# Altium footprint library IC.Pcblib: 91 footprints (part 4 of 6)
Each footprint in its own frame and in the unit in brackets; x right, y up, seen from the top. Pads: shape width x height; smd on the part's side, far side on the other; paste and mask are expansions set on the pad; w line width, h text height; cw(c..) or ccw(c..) is an arc to the next point about the centre after c.
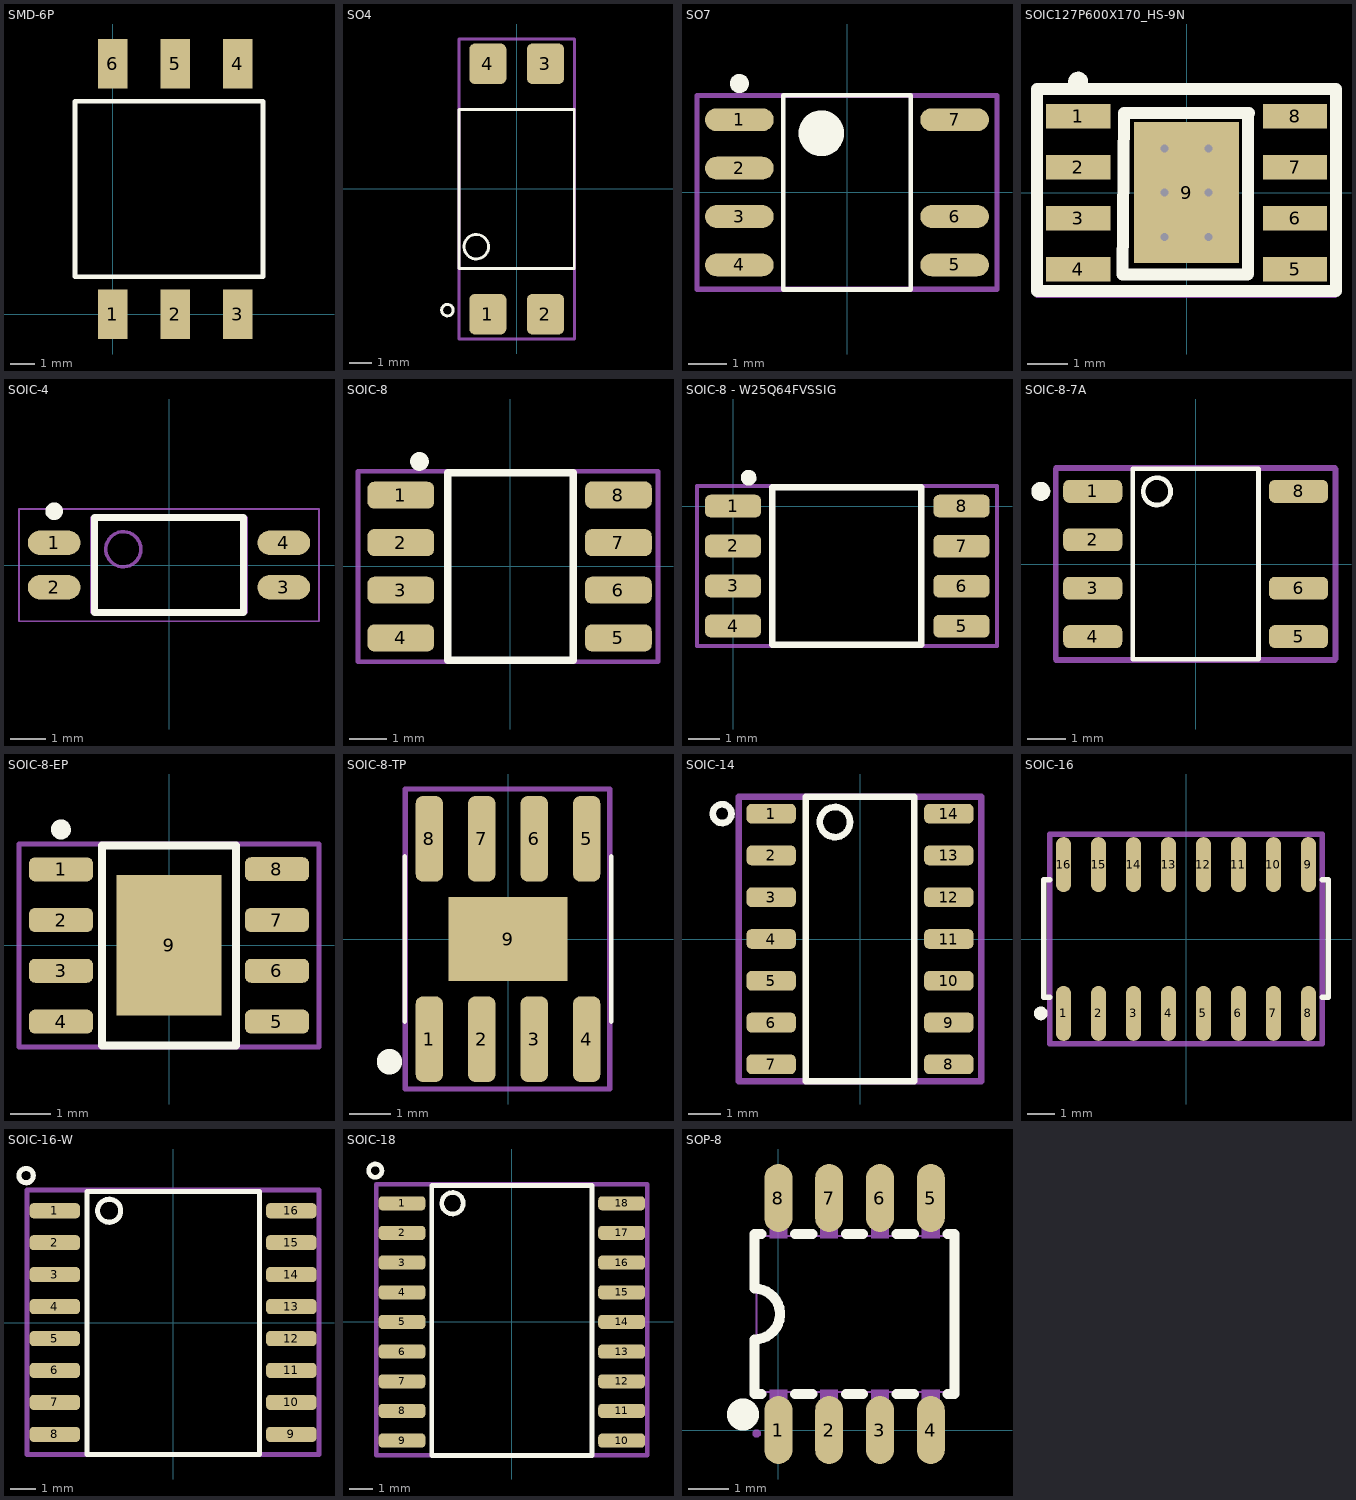
[diagram p3: the footprints below, top view; thin cyan lines are the x and y axes]

## SMD-6P [mm]
pads (6):
  rect 1.2x2 smd: 1(0,0) 2(2.54,0) 3(5.08,0) 4(5.08,10.16) 5(2.54,10.16) 6(0,10.16)
Top Overlay:
  lines w0.2: -1.524,1.524 -1.118,1.524 6.096,1.524 6.096,8.636 -1.524,8.636 -1.524,1.524
  text "." at -1.524,0.508 h5
3D body: height 4.3, standoff 0.7, extent -1.283,1.816 5.855,8.344

## SO4 [mm] "Small Outline IC (SOIC), 2.54 mm pitch; 4 pin, 4.58 mm L X 6.50 mm W X 3.76 mm H body"
height 3.76
pads (4):
  rrect31% 1.63x1.79 smd: 1(-1.27,-5.51) 2(1.27,-5.51) 3(1.27,5.51) 4(-1.27,5.51)
Top Overlay:
  circle w0.127: c-1.778,-2.54 r0.539
  circle w0.127: c-3.048,-5.334 r0.254
  lines w0.12: -2.265,-3.5 -2.54,-3.5 -2.54,3.5 -2.265,3.5 ; 2.265,-3.5 2.54,-3.5 2.54,3.5 2.265,3.5
  lines w0.127: -2.265,-3.5 2.265,-3.5 ; -2.265,3.5 2.265,3.5
Mechanical 13:
  lines w0.12: -2.54,-6.604 2.54,-6.604 2.54,6.604 -2.54,6.604 -2.54,-6.604
  text ".Designator" at 0.6,-3.2 h1.5
Mechanical 15:
  lines w0.127: -2.54,-6.604 -2.54,6.604 2.54,6.604 2.54,-6.604 -2.54,-6.604
  text ".Comment" at 0.3,-3.2 h1.5
3D body "SO4.STEP": height 3.76, standoff 0, extent -2.29,-6 2.29,6

## SO7 [mm]
pads (7):
  oval 1.8x0.6 smd: 1(-2.825,1.905) 2(-2.825,0.635) 3(-2.825,-0.635) 4(-2.825,-1.905) 5(2.825,-1.905) 6(2.825,-0.635) 7(2.825,1.905)
Top Overlay:
  circle w0.6: c-0.675,1.55 r0.3
  circle w0.25: c-2.825,2.855 r0.125
  lines w0.127: -1.675,-2.55 -1.675,2.55 1.675,2.55 1.675,-2.55 -1.675,-2.55
Mechanical 13:
  lines w0.127: -3.937,-2.55 -3.937,2.55 3.937,2.55 3.937,-2.55 -3.937,-2.55
  text ".Designator" at 0,-2.286 h0.64
Mechanical 15:
  lines w0.127: -3.937,-2.54 -3.937,2.54 3.937,2.54 3.937,-2.54 -3.937,-2.54
  text ".Comment" at 0,-2.286 h0.64
3D body "CircuitWorks-SO-8 (PIC12FXXX).step": height 1.6, standoff 0, extent -2.995,-2.45 2.995,2.45

## SOIC127P600X170_HS-9N [mm] "SOIC, 8-Leads, Body 4,90x2,41mm, Pitch 1,27mm, Thermal Pad 3,51x2,62mm, IPC Medium Density"
height 1.7
pads (9):
  rect 1.6x0.61 smd: 1(-2.7,1.905) 2(-2.7,0.635) 3(-2.7,-0.635) 4(-2.7,-1.905) 5(2.7,-1.905) 6(2.7,-0.635) 7(2.7,0.635) 8(2.7,1.905)
  rect 2.62x3.51 smd: 9(0,0)
via 0.55,-1.1 diameter 0.5 hole 0.2
via -0.55,-1.1 diameter 0.5 hole 0.2
via 0.55,0 diameter 0.5 hole 0.2
via -0.55,0 diameter 0.5 hole 0.2
via 0.55,1.1 diameter 0.5 hole 0.2
via -0.55,1.1 diameter 0.5 hole 0.2
Top Overlay:
  circle w0.25: c-2.7,2.76 r0.125
  lines w0.3: -3.73,-2.45 3.72,-2.45 3.72,2.58 -3.73,2.58 -3.73,-2.45 ; -1.6,-2.04 -1.56,1.98 1.55,1.98 1.53,1.96 1.53,-2.03 1.52,-2.04 -1.6,-2.04
Mechanical 15:
  lines w0.03: -3.75,-2.6 3.72,-2.6 3.72,2.6 -3.75,2.6 -3.75,-2.6
  lines w0.1: -0.5,0 0.5,0 ; 0,-0.5 0,0.5

## SOIC-4 [mm] "SOIC, 4-Leads, Body 2.70x4.40mm, Pitch 1.27mm, IPC Medium Density"
height 2
pads (4):
  oval 1.5x0.7 smd: 1(-3.275,0.635) 2(-3.275,-0.635) 3(3.275,-0.635) 4(3.275,0.635)
Top Overlay:
  circle w0.25: c-3.275,1.535 r0.125
  lines w0.2: -2.125,-1.35 2.125,-1.35 2.125,1.35 -2.125,1.35 -2.125,-1.35
Mechanical 13:
  circle w0.1: c-1.3,0.45 r0.5
  lines w0.1: -2.2,-1.35 2.2,-1.35 2.2,1.35 -2.2,1.35 -2.2,-1.35
Mechanical 15:
  lines w0.05: -4.275,-1.6 4.275,-1.6 4.275,1.6 -4.275,1.6 -4.275,-1.6
3D body "SOIC127P720X200-4N.step": height 2, standoff 0, extent -3.575,-1.35 3.575,1.35

## SOIC-8 [mm]
height 1.44
pads (8):
  rrect50% 1.78x0.72 smd: 1(-2.921,1.9) 2(-2.921,0.635) 3(-2.921,-0.635) 4(-2.921,-1.905) 5(2.881,-1.905) 6(2.881,-0.635) 7(2.881,0.635) 8(2.881,1.905)
Top Overlay:
  lines w0.2: -1.675,-2.5 1.675,-2.5 1.675,2.5 -1.675,2.5 -1.675,-2.5
  lines w0.25: -2.311,2.851 ccw(c-2.425,2.8) -2.3,2.8
Mechanical 13:
  lines w0.127: -4.064,-2.54 3.937,-2.54 3.937,2.54 -4.064,2.54 -4.064,-2.54
  text ".Designator" at -0.127,2.286 h1
Mechanical 15:
  lines w0.127: -4.064,-2.54 -4.064,2.54 3.937,2.54 3.937,-2.54 -4.064,-2.54
  text ".Comment" at -0.127,2.286 h1
3D body "SOIC-81.step": height 1.44, standoff 0, extent -3.015,-2.5 3.015,2.5

## SOIC-8 - W25Q64FVSSIG [mm]
height 1.44
pads (8):
  rrect50% 1.78x0.72 smd: 1(0,0) 2(0,-1.265) 3(0,-2.535) 4(0,-3.805) 5(7.25,-3.81) 6(7.25,-2.54) 7(7.25,-1.27) 8(7.25,0)
Top Overlay:
  lines w0.2: 1.246,-4.4 1.246,0.6 5.975,0.6 5.975,-4.4 1.246,-4.4
  lines w0.25: 0.61,0.951 ccw(c0.496,0.9) 0.621,0.9
Mechanical 13:
  lines w0.127: -1.143,-4.44 -1.143,0.64 8.375,0.64 8.375,-4.44 -1.143,-4.44
  text ".Designator" at 2.794,0.386 h1
Mechanical 15:
  lines w0.127: -1.143,-4.44 8.375,-4.44 8.375,0.64 -1.143,0.64 -1.143,-4.44
  text ".Comment" at 2.794,0.386 h1
3D body "SOIC-81.step": height 1.44, standoff 0, extent 0.595,-4.375 6.625,0.625

## SOIC-8-7A [mm]
pads (7):
  rrect52% 1.55x0.6 smd: 1(-2.7,1.905) 2(-2.7,0.635) 3(-2.7,-0.635) 4(-2.7,-1.905) 5(2.7,-1.905) 6(2.7,-0.635) 8(2.7,1.905)
Top Overlay:
  circle w0.25: c-4.064,1.905 r0.125
  circle w0.127: c-1.016,1.905 r0.359
  lines w0.127: -1.651,-2.5 1.651,-2.5 1.651,2.5 -1.651,2.5 -1.651,-2.5
Mechanical 13:
  lines w0.127: -3.683,-2.5 3.683,-2.5 3.683,2.5 -3.683,2.5 -3.683,-2.5
  text ".Designator" at -3.175,0.635 h0.64
Mechanical 15:
  lines w0.127: -3.66,-2.54 -3.66,2.54 3.66,2.54 3.66,-2.54 -3.66,-2.54
  text ".Comment" at -2.794,0.635 h0.64
3D body "CircuitWorks-SO-8 (PIC12FXXX).step": height 1.6, standoff 0, extent -2.995,-2.485 2.995,2.415

## SOIC-8-EP [mm]
height 1.44
pads (9):
  rrect50% 1.6x0.6 smd: 1(-2.7,1.9) 2(-2.7,0.635) 3(-2.7,-0.635) 4(-2.7,-1.905) 5(2.7,-1.905) 6(2.7,-0.635) 7(2.7,0.635) 8(2.7,1.905)
  rect 2.62x3.51 smd: 9(0,0)
Top Overlay:
  lines w0.2: -1.675,-2.5 1.675,-2.5 1.675,2.5 -1.675,2.5 -1.675,-2.5
  lines w0.25: -2.586,2.951 ccw(c-2.7,2.9) -2.575,2.9
Mechanical 13:
  lines w0.127: -3.75,-2.54 3.75,-2.54 3.75,2.54 -3.75,2.54 -3.75,-2.54
  text ".Designator" at -0.127,2.286 h1
Mechanical 15:
  lines w0.127: -3.75,-2.54 -3.75,2.54 3.75,2.54 3.75,-2.54 -3.75,-2.54
  text ".Comment" at -0.127,2.286 h1
3D body "SOIC-81.step": height 1.44, standoff 0, extent -3.015,-2.5 3.015,2.5

## SOIC-8-TP [mm] "Small Outline IC (SOIC with Tab), 1.27 mm pitch; 8 pin, 4.90 mm L X 3.90 mm W X 1.70 mm H body"
height 1.7
pads (9):
  rrect52% 0.66x2.07 smd: 1(-1.905,-2.425) 2(-0.635,-2.425) 3(0.635,-2.425) 4(1.905,-2.425) 5(1.905,2.425) 6(0.635,2.425) 7(-0.635,2.425) 8(-1.905,2.425)
  rect 2.875x2.025 smd paste-2.875: 9(0,0)
Top Overlay:
  circle w0.5: c-2.87,-2.972 r0.057
  lines w0.12: -2.5,-2 -2.5,2 ; 2.5,-2 2.5,2
Top Paste:
  region: 1.205,-0.785 0.115,-0.785 0.115,-0.115 1.205,-0.115
  region: 1.205,0.115 0.115,0.115 0.115,0.785 1.205,0.785
  region: -0.115,-0.785 -1.205,-0.785 -1.205,-0.115 -0.115,-0.115
  region: -0.115,0.115 -1.205,0.115 -1.205,0.785 -0.115,0.785
Mechanical 13:
  lines w0.127: -2.489,-3.632 -2.489,3.632 2.464,3.632 2.464,-3.632 -2.489,-3.632
  text ".Designator" at 0.279,-3.632 h1.5
Mechanical 15:
  lines w0.127: -2.489,-3.632 -2.489,3.632 2.464,3.632 2.464,-3.632 -2.489,-3.632
  text ".Comment" at 0.254,-3.581 h1.5
3D body "SOIC-8-TP.STEP": height 1.7, standoff 0, extent -2.45,-3 2.45,3

## SOIC-14 [mm]
pads (14):
  rrect52% 1.5x0.6 smd: 1(-2.7,3.81) 2(-2.7,2.54) 3(-2.7,1.27) 4(-2.7,0) 5(-2.7,-1.27) 6(-2.7,-2.54) 7(-2.7,-3.81) 8(2.7,-3.81) 9(2.7,-2.54) 10(2.7,-1.27) 11(2.7,0) 12(2.7,1.27) 13(2.7,2.54) 14(2.7,3.81)
Top Overlay:
  circle w0.2: c-0.762,3.556 r0.458
  circle w0.2: c-4.191,3.81 r0.284
  lines w0.2: -1.651,-4.318 -1.651,4.318 1.651,4.318 1.651,-4.318 -1.651,-4.318
Mechanical 13:
  lines w0.2: -3.683,-4.318 3.683,-4.318 3.683,4.318 -3.683,4.318 -3.683,-4.318
Mechanical 15:
  lines w0.2: -3.683,-4.318 3.683,-4.318 3.683,4.318 -3.683,4.318 -3.683,-4.318
3D body "SOIC127P600X175-14N.step": height 1.75, standoff 0, extent -2.952,-4.3 3.048,4.3

## SOIC-16 [mm]
pads (16):
  oval 0.55x2 smd: 1(-4.445,-2.7) 2(-3.175,-2.7) 3(-1.905,-2.7) 4(-0.635,-2.7) 5(0.635,-2.7) 6(1.905,-2.7) 7(3.175,-2.7) 8(4.445,-2.7) 9(4.445,2.7) 10(3.175,2.7) 11(1.905,2.7) 12(0.635,2.7) 13(-0.635,2.7) 14(-1.905,2.7) 15(-3.175,2.7) 16(-4.445,2.7)
Top Overlay:
  circle w0.25: c-5.27,-2.7 r0.125
  lines w0.2: -4.953,2.159 -5.156,2.159 -5.156,-2.108 -4.95,-2.108 ; 4.95,-2.108 5.156,-2.108 5.156,2.159 4.953,2.159
Mechanical 13:
  lines w0.2: -4.95,-3.81 -4.95,3.81 4.95,3.81 4.95,-3.81 -4.95,-3.81
  text ".Designator" at -3.277,0 h1.5
Mechanical 15:
  lines w0.2: -4.953,-3.81 -4.953,3.81 4.953,3.81 4.953,-3.81 -4.953,-3.81
  text ".Comment" at -3.251,0 h1.5
3D body "User Library-SOIC-16-1.step": height 1.4, standoff 0, extent -4.95,-3 4.95,3

## SOIC-16-2 [mm]

## SOIC-16-W [mm]
pads (16):
  rrect52% 2x0.6 smd: 1(-4.7,4.445) 2(-4.7,3.175) 3(-4.7,1.905) 4(-4.7,0.635) 5(-4.7,-0.635) 6(-4.7,-1.905) 7(-4.7,-3.175) 8(-4.7,-4.445) 9(4.7,-4.445) 10(4.7,-3.175) 11(4.7,-1.905) 12(4.7,-0.635) 13(4.7,0.635) 14(4.7,1.905) 15(4.7,3.175) 16(4.7,4.445)
Top Overlay:
  circle w0.2: c-2.54,4.445 r0.458
  circle w0.2: c-5.842,5.842 r0.284
  lines w0.2: -3.429,-5.25 -3.429,5.207 3.429,5.207 3.429,-5.25 -3.429,-5.25
Mechanical 13:
  lines w0.2: -5.8,-5.25 -5.8,5.265 5.8,5.265 5.8,-5.25 -5.8,-5.25
  text ".Designator" at -4.2,-1.535 h1.5
3D body "User Library-SOIC16_Wide_JEDEC_MS-013AA.step": height 2.72, standoff 0.07, extent -5.34,-5.25 5.29,5.25

## SOIC-18 [mm]
pads (18):
  rrect52% 2x0.6 smd: 1(-4.7,5.08) 2(-4.7,3.81) 3(-4.7,2.54) 4(-4.7,1.27) 5(-4.7,0) 6(-4.7,-1.27) 7(-4.7,-2.54) 8(-4.7,-3.81) 9(-4.7,-5.08) 10(4.7,-5.08) 11(4.7,-3.81) 12(4.7,-2.54) 13(4.7,-1.27) 14(4.7,0) 15(4.7,1.27) 16(4.7,2.54) 17(4.7,3.81) 18(4.7,5.08)
Top Overlay:
  circle w0.2: c-2.54,5.08 r0.458
  circle w0.2: c-5.842,6.477 r0.284
  lines w0.2: -3.429,-5.715 -3.429,5.842 3.429,5.842 3.429,-5.715 -3.429,-5.715
Mechanical 13:
  lines w0.2: -5.8,-5.7 -5.8,5.9 5.8,5.9 5.8,-5.7 -5.8,-5.7
  text ".Designator" at -4.2,-0.9 h1.5
Mechanical 15:
  lines w0.2: -5.8,-5.7 5.8,-5.7 5.8,5.9 -5.8,5.9 -5.8,-5.7
  text ".Comment" at -4.2,-0.6 h1.5
3D body "User Library-SOIC18-300.step": height 2.65, standoff 0, extent -5.15,-5.665 5.15,5.865

## SOP-8 [mm]
pads (8):
  oval 0.7x1.7 smd: 1(0,0) 2(1.27,0) 3(2.54,0) 4(3.81,0) 5(3.81,5.8) 6(2.54,5.8) 7(1.27,5.8) 8(0,5.8)
Top Overlay:
  lines w0.254: -0.421,0.9 -0.595,0.9 -0.595,2.265 ccw(c-0.595,2.9) -0.594,3.535 -0.595,4.9 -0.421,4.9 ; 0.421,0.9 0.849,0.9 ; 0.421,4.9 0.849,4.9 ; 1.691,0.9 2.119,0.9 ; 1.691,4.9 2.119,4.9 ; 2.961,0.9 3.389,0.9 ; 2.961,4.9 3.389,4.9 ; 4.231,0.9 4.405,0.9 4.405,4.9 4.231,4.9
  lines w0.4: -0.889,0.589 ccw(c-0.888,0.389) -0.886,0.589
Mechanical 15:
  region: -0.22,-0.09 -0.22,0.635 0.22,0.635 0.22,-0.09
  region: -0.22,0.585 -0.22,1 0.22,1 0.22,0.585
  region: 1.05,-0.09 1.05,0.635 1.49,0.635 1.49,-0.09
  region: 1.05,0.585 1.05,1 1.49,1 1.49,0.585
  region: 2.32,-0.09 2.32,0.635 2.76,0.635 2.76,-0.09
  region: 2.32,0.585 2.32,1 2.76,1 2.76,0.585
  region: 3.59,-0.09 3.59,0.635 4.03,0.635 4.03,-0.09
  region: 3.59,0.585 3.59,1 4.03,1 4.03,0.585
  region: -0.22,5.165 -0.22,5.89 0.22,5.89 0.22,5.165
  region: -0.22,4.8 -0.22,5.215 0.22,5.215 0.22,4.8
  region: 1.05,5.165 1.05,5.89 1.49,5.89 1.49,5.165
  region: 1.05,4.8 1.05,5.215 1.49,5.215 1.49,4.8
  region: 2.32,5.165 2.32,5.89 2.76,5.89 2.76,5.165
  region: 2.32,4.8 2.32,5.215 2.76,5.215 2.76,4.8
  region: 3.59,5.165 3.59,5.89 4.03,5.89 4.03,5.165
  region: 3.59,4.8 3.59,5.215 4.03,5.215 4.03,4.8
  region: -0.445,-0.09 -0.446,-0.05 -0.505,0.007 -0.585,0.007 -0.644,-0.05 -0.645,-0.09 -0.644,-0.131 -0.585,-0.187 -0.505,-0.187 -0.446,-0.131
  lines w0.051: -0.545,0.95 4.355,0.95 4.355,4.85 -0.545,4.85 -0.545,0.95
3D body "3.step": height 1.8, standoff 0, extent -0.576,-0.179 4.42,6.021